# Altium footprint library User.PcbLib: 317 footprints (part 7 of 20)
Each footprint in its own frame and in the unit in brackets; x right, y up, seen from the top. Pads: shape width x height; smd on the part's side, far side on the other; paste and mask are expansions set on the pad; w line width, h text height; cw(c..) or ccw(c..) is an arc to the next point about the centre after c.
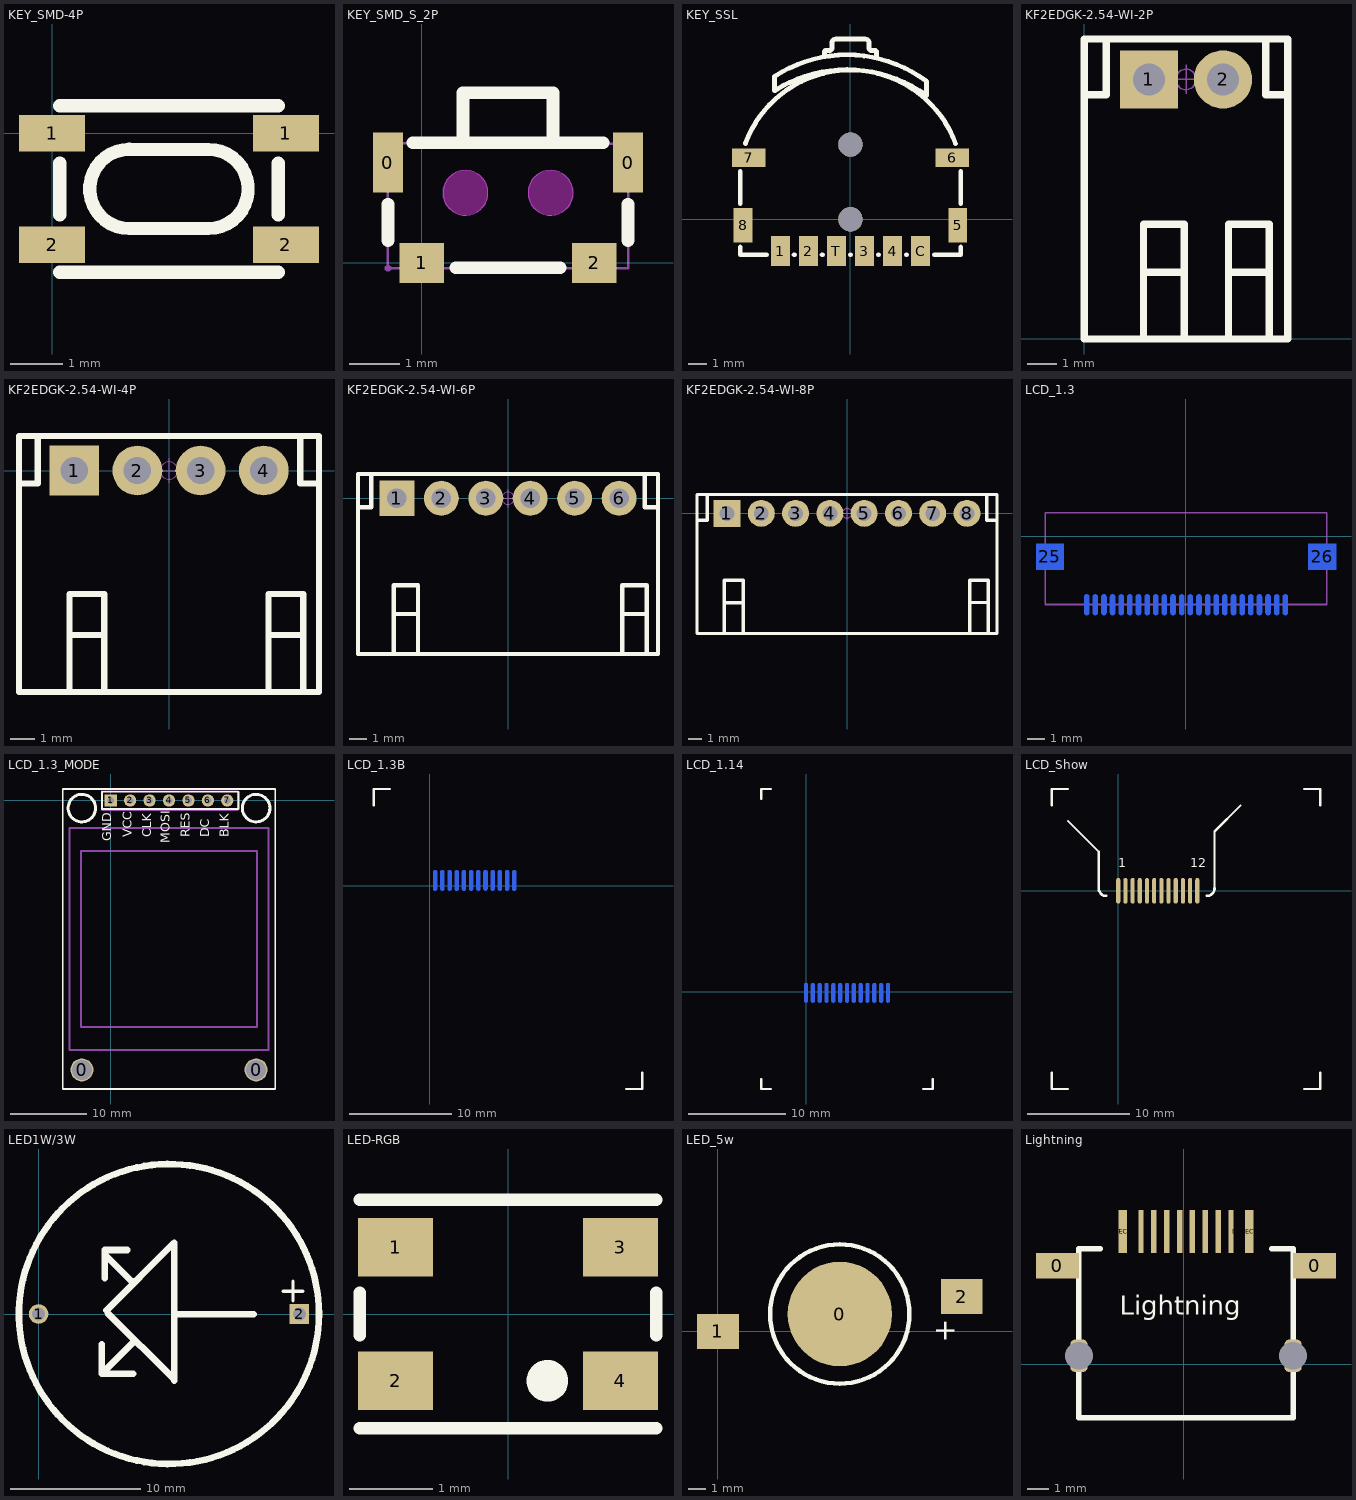
[diagram p6: the footprints below, top view; thin cyan lines are the x and y axes]

## KEY_SMD-4P [mm] "3*4*2.5MM"
pads (4):
  rect 1.27x0.7 smd: 1(0,0) 1(4.5,0) 2(0,-2.15) 2(4.5,-2.15)
Top Overlay:
  lines w0.254: 0.15,-2.675 4.35,-2.675 ; 0.15,-1.569 0.15,-0.581 ; 0.15,0.525 4.35,0.525 ; 0.151,-0.58 0.15,-0.581 ; 4.35,-1.569 4.35,-0.581 ; 0.15,-0.581 0.15,-0.581 ; 1.487,-1.836 cw(c1.487,-1.074) 1.487,-0.312 3.012,-0.313 cw(c3.012,-1.075) 3.011,-1.836 1.487,-1.836
3D body "3D_PCB4_2022-03-06.step": height 2.51, standoff 0, extent -0.099,-2.675 4.6,0.525

## KEY_SMD_S_2P [mil]
pads (4):
  rect 23.6x47.2 smd mask+2: 0(-26.6,78.8) 0(162.4,78.8)
  rect 35.4x31.5 smd mask+2: 1(0,0) 2(135.8,0)
Top Overlay:
  lines w10: -26.6,17.5 -26.6,46 ; -6.9,94.5 142.7,94.5 ; 26.8,-3.9 109,-3.9 ; 32.5,94.5 32.5,133.9 103.3,133.9 103.3,94.5 ; 162.4,17.5 162.4,46
Keep-Out Layer:
  board cut-out: 83.7,55.1 83.7,51.58 86.39,45.07 91.37,40.09 97.88,37.4 104.92,37.4 111.43,40.09 116.41,45.07 119.1,51.58 119.1,55.1 119.1,58.62 116.41,65.13 111.43,70.11 104.92,72.8 97.88,72.8 91.37,70.11 86.39,65.13 83.7,58.62
  board cut-out: 16.7,55.1 16.7,51.58 19.39,45.07 24.37,40.09 30.88,37.4 37.92,37.4 44.43,40.09 49.41,45.07 52.1,51.58 52.1,55.1 52.1,58.62 49.41,65.13 44.43,70.11 37.92,72.8 30.88,72.8 24.37,70.11 19.39,65.13 16.7,58.62
Mechanical 1:
  circle w0.2: c101.4,55.1 r17.7
  circle w0.2: c34.4,55.1 r17.7
Mechanical 15:
  region: 145.7,11.4 145.7,-4.3 126,-4.3 126,11.4
  region: 9.8,11.4 9.8,-4.3 -9.9,-4.3 -9.9,11.4
  region: 162.4,63 154.5,63 154.5,94.5 162.4,94.5
  region: -18.7,63 -26.6,63 -26.6,94.5 -18.7,94.5
  region: -29,-4.3 -29,-5.29 -27.59,-6.7 -25.61,-6.7 -24.2,-5.29 -24.2,-4.3 -24.2,-3.31 -25.61,-1.9 -27.59,-1.9 -29,-3.31
  lines w2: -26.6,-4.3 162.4,-4.3 162.4,93.7 104.1,93.7 103.7,94.1 103.7,132.7 104.1,133.1 32.5,133.5 32.5,94.1 -26.6,94.1 -26.6,-4.3
3D body "3D_PCB3_2022-03-08.step": height 74.8, standoff -15.76, extent -26.5,-7 162.5,126.88

## KEY_SSL [mm] "4PIN"
pads (12):
  rect 1x1.6 smd: 1(-3.75,-1.7) 2(-2.25,-1.7) 3(0.75,-1.7) 4(2.25,-1.7) C(3.75,-1.7) T(-0.75,-1.7)
  rect 1x1.85 smd: 5(5.75,-0.325) 8(-5.75,-0.325)
  rect 1.8x1 smd: 6(5.45,3.3) 7(-5.45,3.3)
  round 1.3 hole 1.3 unplated: ""(0,0) ""(0,4)
Top Overlay:
  lines w0.254: -5.9,-1.481 -5.9,-1.9 -4.481,-1.9 ; -5.9,0.831 -5.9,2.569 ; -5.623,4.048 cw(c0,2.002) 5.623,4.048 ; -3.019,-1.9 -2.981,-1.9 ; -1.519,-1.9 -1.481,-1.9 ; -1.4,8.94 cw(c-1.301,8.941) -1.3,9.04 ; -1.397,8.736 -1.397,8.939 ; -1.295,9.041 -1.092,9.041 ; -1.1,9.04 ccw(c-1.1,9.14) -1,9.14 ; -1,9.44 cw(c-0.799,9.439) -0.8,9.64 ; -0.991,9.142 -0.991,9.447 ; -0.787,9.65 0.787,9.65 ; -0.019,-1.9 0.019,-1.9 ; 0.8,9.64 cw(c0.799,9.439) 1,9.44 ; 0.991,9.142 0.991,9.447 ; 1,9.14 ccw(c1.1,9.14) 1.1,9.04 ; 1.092,9.041 1.295,9.041 ; 1.3,9.04 cw(c1.301,8.941) 1.4,8.94 ; 1.397,8.736 1.397,8.939 ; 1.481,-1.9 1.519,-1.9 ; 2.981,-1.9 3.019,-1.9 ; 4.481,-1.9 5.9,-1.9 5.9,-1.481 ; 5.9,0.831 5.9,2.569 ; -4.064,6.882 cw(c-0.186,0.802) 4.064,6.628 4.064,7.39 ccw(c-0.181,1.727) -4.064,7.644 -4.064,6.882

## KF2EDGK-2.54-WI-2P [mm] "长：6.93mm，宽：10.1mm，高：8.1mm"
pads (2):
  rect 2x2 hole 1.1: 1(2.22,8.898)
  round 2 hole 1.1: 2(4.76,8.898)
Top Overlay:
  lines w0.254: 0,8.38 0.757,8.38 0.757,10.285 ; 2.032,-0.002 2.032,3.935 3.429,3.935 3.429,-0.002 ; 2.032,2.284 3.429,2.284 ; 4.948,-0.002 4.948,3.935 6.345,3.935 6.345,-0.002 ; 4.948,2.284 6.345,2.284 ; 6.223,10.285 6.223,8.38 6.98,8.38 ; 0,-0.002 6.98,-0.002 6.98,10.285 0,10.285 0,-0.002
Mechanical 15:
  circle w0.05: c3.49,8.9 r0.35
  lines w0.05: 2.99,8.9 3.99,8.9 ; 3.49,8.4 3.49,9.4
3D body "KF2EDGK-2.54-WI-2P.STEP": height 8.15, standoff -3.25, extent 0,0 6.98,10.1

## KF2EDGK-2.54-WI-4P [mm] "长：12.06mm，宽：10.1mm，高：8.1mm"
pads (4):
  rect 2x2 hole 1.1: 1(-3.81,0)
  round 2 hole 1.1: 2(-1.27,0) 3(1.27,0) 4(3.81,0)
Top Overlay:
  lines w0.254: -6.03,-0.518 -5.273,-0.518 -5.273,1.387 ; -3.998,-8.9 -3.998,-4.963 -2.601,-4.963 -2.601,-8.9 ; -3.998,-6.614 -2.601,-6.614 ; 3.998,-8.9 3.998,-4.963 5.395,-4.963 5.395,-8.9 ; 3.998,-6.614 5.395,-6.614 ; 5.273,1.387 5.273,-0.518 6.03,-0.518 ; -6.03,-8.9 6.03,-8.9 6.03,1.387 -6.03,1.387 -6.03,-8.9
Mechanical 15:
  circle w0.05: c0,0 r0.35
  lines w0.05: -0.5,0 0.5,0 ; 0,-0.5 0,0.5
3D body "KF2EDGK-2.54-WI-4P.STEP": height 8.15, standoff -3.25, extent -6.03,-8.9 6.03,1.2

## KF2EDGK-2.54-WI-6P [mm] "长：17.1mm，宽：10.1mm，高：8.1mm"
pads (6):
  rect 2x2 hole 1.1: 1(-6.35,0.01)
  round 2 hole 1.1: 2(-3.81,0.01) 3(-1.27,0.01) 4(1.27,0.01) 5(3.81,0.01) 6(6.35,0.01)
Top Overlay:
  lines w0.254: -8.57,-0.508 -7.813,-0.508 -7.813,1.397 ; -6.538,-8.89 -6.538,-4.953 -5.141,-4.953 -5.141,-8.89 ; -6.538,-6.604 -5.141,-6.604 ; 6.538,-8.89 6.538,-4.953 7.935,-4.953 7.935,-8.89 ; 6.538,-6.604 7.935,-6.604 ; 7.813,1.397 7.813,-0.508 8.57,-0.508 ; -8.57,-8.89 -8.57,1.397 8.57,1.397 8.57,-8.89 -8.57,-8.89
Mechanical 15:
  circle w0.05: c0,0.01 r0.35
  lines w0.05: -0.5,0.01 0.5,0.01 ; 0,-0.49 0,0.51
3D body "KF2EDGK-2.54-WI-6P.STEP": height 8.15, standoff -3.25, extent -8.57,-8.89 8.57,1.21

## KF2EDGK-2.54-WI-8P [mm] "长：22.22mm，宽：10.1mm，高：8.1mm"
pads (8):
  rect 2x2 hole 1.1: 1(-8.89,0)
  round 2 hole 1.1: 2(-6.35,0) 3(-3.81,0) 4(-1.27,0) 5(1.27,0) 6(3.81,0) 7(6.35,0) 8(8.89,0)
Top Overlay:
  lines w0.254: -11.11,-0.518 -10.353,-0.518 -10.353,1.387 ; -11.11,1.387 -11.11,-8.9 11.11,-8.9 ; -11.11,1.397 11.11,1.397 11.11,-8.89 ; -9.078,-8.9 -9.078,-4.963 -7.681,-4.963 -7.681,-8.9 ; -9.078,-6.614 -7.681,-6.614 ; 9.078,-8.89 9.078,-4.953 10.475,-4.953 10.475,-8.89 ; 9.078,-6.604 10.475,-6.604 ; 10.353,1.397 10.353,-0.508 11.11,-0.508
Mechanical 15:
  circle w0.05: c0,0 r0.35
  lines w0.05: -0.5,0 0.5,0 ; 0,-0.5 0,0.5
3D body "KF2EDGK-2.54-WI-8P.STEP": height 8.15, standoff -3.25, extent -11.11,-8.9 11.11,1.2

## LCD_1.3 [mm]
pads (26):
  oval 0.3x1.2 smd far side: 1(-5.75,-3.958) 2(-5.25,-3.958) 3(-4.75,-3.958) 4(-4.25,-3.958) 5(-3.75,-3.958) 6(-3.25,-3.958) 7(-2.75,-3.958) 8(-2.25,-3.958) 9(-1.75,-3.958) 10(-1.25,-3.958) 11(-0.75,-3.958) 12(-0.25,-3.958) 13(0.25,-3.958) 14(0.75,-3.958) 15(1.25,-3.958) 16(1.75,-3.958) 17(2.25,-3.958) 18(2.75,-3.958) 19(3.25,-3.958) 20(3.75,-3.958) 21(4.25,-3.958) 22(4.75,-3.958) 23(5.25,-3.958) 24(5.75,-3.958)
  rect 1.6x1.5 smd far side: 25(-7.882,-1.169) 26(7.882,-1.169)
Bottom Overlay:
  lines w0.25: -8.15,-2.375 -8.15,-3.94 -6.35,-3.94 ; -8.15,-0.025 -8.15,1.36 8.15,1.36 8.15,-0.025 ; 6.35,-3.94 8.15,-3.94 8.15,-2.375
  text "1" at -6.351,-4.5 h1.52
Mechanical 15:
  lines w0.1: -8.15,-3.94 8.15,-3.94 8.15,1.36 -8.15,1.36 -8.15,-3.94
3D body: height 10, standoff 9, extent -10.175,-28.025 16.425,3.37
3D body: height 10.2, standoff 9, extent -9.186,-26.975 15.5,-2.38
3D body "HEADER-FPC-ZIF-SMD-Horizontal-0.5-24.stp": height 2.2, standoff -0.05, extent -8.05,-4.8 8.05,1.699

## LCD_1.3_MODE [mm]
pads (9):
  round 3 hole 2.6: 0(-3.77,-35.22) 0(19.01,-35.22)
  rect 1.6x1.6 hole 0.9: 1(0,0)
  round 1.6 hole 0.9: 2(2.54,0) 3(5.08,0) 4(7.62,0) 5(10.16,0) 6(12.7,0) 7(15.24,0)
Top Overlay:
  circle w0.4: c19.01,-1 r1.798
  circle w0.4: c-3.77,-1 r1.798
  lines w0.254: -6.27,-3.61 -6.27,1.5 ; -6.27,1.5 21.51,1.5 21.51,-37.72 -6.27,-37.72 -6.27,1.5 ; -1.143,-1.143 -1.143,1.143 16.7,1.143 16.7,-1.143 -1.143,-1.143
  text "BLK" at 15.85,-4.826 h2.03
  text "DC" at 13.291,-4.826 h2.03
  text "RES" at 10.751,-4.826 h2.03
  text "MOSI" at 8.109,-5.588 h2.03
  text "CLK" at 5.671,-4.824 h2.03
  text "VCC" at 3.131,-4.826 h2.03
  text "GND" at 0.489,-5.332 h2.03
Mechanical 15:
  lines w0.1: -1.18,-1.3 -1.18,1.3 16.62,1.3 16.62,-1.3 -1.18,-1.3
  lines w0.254: -5.38,-32.61 20.62,-32.61 20.62,-3.61 -5.38,-3.61 -5.38,-32.61 ; -3.88,-29.61 19.12,-29.61 19.12,-6.61 -3.88,-6.61 -3.88,-29.61
3D body "M3x8+6.STEP": height -1.95, standoff -15.95, extent -6.468,-37.57 -1.072,-32.87
3D body "M3x8+6.STEP": height -1.95, standoff -15.95, extent 16.312,-37.57 21.708,-32.87
3D body "HEADER 2.54X7.stp": height -1.9, standoff -13.1, extent -1.143,-1.228 16.637,1.27
3D body: height 11, standoff 10.5, extent -5.38,-32.61 20.599,-3.61
3D body: height 10.8, standoff 10, extent -6.27,-37.72 21.51,1.5
3D body "M3x6.STEP": height 17.05, standoff 11.05, extent 16.312,-37.57 21.708,-32.87
3D body "M3x6.STEP": height 17.05, standoff 11.05, extent -6.468,-37.57 -1.072,-32.87
3D body: height 11.3, standoff 11, extent -3.9,-29.642 19.12,-6.61

## LCD_1.3B [mm]
pads (12):
  oval 0.4x2 smd far side: 1(0.508,0.5) 2(1.208,0.5) 3(1.908,0.5) 4(2.608,0.5) 5(3.308,0.5) 6(4.008,0.5) 7(4.708,0.5) 8(5.408,0.5) 9(6.108,0.5) 10(6.808,0.5) 11(7.508,0.5) 12(8.208,0.5)
Top Overlay:
  lines w0.203: -5.48,7.808 -5.48,9.408 -3.88,9.408 ; 19.08,-19.812 20.68,-19.812 20.68,-18.212
Bottom Overlay:
  lines w0.203: -3.384,6.572 -3.384,4.032 -3.144,3.792 -1.144,3.792 -1.144,-0.008 ; 10.136,-0.008 10.136,4.335
  lines w0.254: -1.144,0.242 ccw(c-0.394,0.242) -0.394,-0.508 ; 9.386,-0.508 ccw(c9.386,0.242) 10.136,0.242
  text "1" at 0.771,2.16 h1.52
3D body: height 0.8, standoff 0.7, extent -5.48,-19.812 20.68,9.408
3D body: height 1, standoff 0.82, extent -3.88,-18.212 19.08,7.808

## LCD_1.14 [mm] "ST7789"
pads (13):
  oval 0.4x2 smd far side: 1(8.4,-0.127) 2(7.7,-0.127) 3(7,-0.127) 4(6.3,-0.127) 5(5.6,-0.127) 6(4.9,-0.127) 7(4.2,-0.127) 8(3.5,-0.127) 9(2.8,-0.127) 10(2.1,-0.127) 11(1.4,-0.127) 12(0.7,-0.127) 13(0,-0.127)
Top Overlay:
  lines w0.254: -4.6,-8.984 -4.6,-9.984 -3.6,-9.984 ; -4.6,19.762 -4.6,20.762 -3.6,20.762 ; 12,-9.984 13,-9.984 13,-8.984
Bottom Overlay:
  circle w0.254: c9.4,-3.746 r0.6
  circle w0.254: c-1,-3.746 r0.6
  lines w0.254: -2,-7.493 -2,0.254 ; -2,-3.746 -2,-1.746 -2,0.254 ; -1,0.254 -2,0.254 ; 9.4,0.254 10.4,0.254 10.4,-1.746 10.4,-3.746
  text "1" at 8.128,-1.746 h2.03
3D body: height 0.9, standoff 0.6, extent -4.064,-9.398 12.446,20.066
3D body: height 0.7, standoff 0.4, extent -4.6,-9.906 13,20.574

## LCD_Show [mm]
pads (12):
  oval 0.4x2.5 smd: 1(0,0) 2(0.7,0) 3(1.4,0) 4(2.1,0) 5(2.8,0) 6(3.5,0) 7(4.2,0) 8(4.9,0) 9(5.6,0) 10(6.3,0) 11(7,0) 12(7.7,0)
Top Overlay:
  lines w0.203: -6.48,-17.704 -6.48,-19.304 -4.88,-19.304 ; -6.48,8.316 -6.48,9.916 -4.88,9.916 ; -4.88,6.78 -1.9,3.8 -1.9,0 ; 9.38,0 9.38,5.78 11.925,8.325 ; 18.08,-19.304 19.68,-19.304 19.68,-17.704 ; 18.08,9.916 19.68,9.916 19.68,8.316
  lines w0.254: -1.9,0.25 ccw(c-1.15,0.25) -1.15,-0.5 ; 8.63,-0.5 ccw(c8.63,0.25) 9.38,0.25
  text "12" at 7,1.979 h1.52
  text "1" at 0,1.979 h1.52
3D body: height 1, standoff 0.82, extent -4.88,-17.704 18.08,8.316
3D body: height 0.8, standoff 0.7, extent -6.48,-19.304 19.68,9.916

## LED1W/3W [mm]
pads (2):
  round 1.5 hole 1: 1(0,0)
  rect 1.5x1.5 hole 1: 2(20,0)
Top Overlay:
  circle w0.508: c10,0 r11.5
  lines w0.254: 18.75,1.75 20.25,1.75 ; 19.5,1 19.5,2.5
  lines w0.508: 4.851,-2.311 4.851,-4.572 ; 5.08,2.743 5.08,4.902 6.807,4.902 ; 5.08,4.572 7.137,2.515 7.29,2.515 ; 5.207,0.279 10.389,5.461 ; 5.296,0.089 10.414,-5.029 10.414,-5.105 10.414,5.461 ; 7.239,-4.572 4.851,-4.572 ; 7.315,-2.057 7.315,-2.108 4.851,-4.572 ; 10.432,-0.025 16.485,-0.025

## LED-RGB [mm]
pads (4):
  rect 0.9x0.7 smd: 1(-1.35,0.8) 2(-1.35,-0.8) 3(1.35,0.8) 4(1.35,-0.8)
Top Overlay:
  circle w0.25: c0.472,-0.802 r0.125
  lines w0.152: -1.778,-1.372 1.778,-1.372 ; -1.778,-0.254 -1.778,0.254 ; -1.778,1.372 1.778,1.372 ; 1.778,-0.254 1.778,0.254
3D body "User Library-LED_ASMT-QTB0-0AA02.STEP": height 1.95, standoff -0.05, extent -1.815,-1.7 1.785,1.7

## LED_5w [mm]
pads (3):
  round 6 smd: 0(7,1)
  rect 2.4x2 smd: 1(0,0) 2(14,2)
Top Overlay:
  circle w0.254: c7,1 r4
  text "+" at 13.997,-0.652 h2.03

## Lightning [mm]
pads (14):
  rect 2x1.2 smd: 0(-5.9,4.6) 0(6.1,4.6)
  rect 0.254x2 smd: 1(2.2,6.2) 2(1.6,6.2) 3(1,6.2) 4(0.4,6.2) 5(-0.2,6.2) 6(-0.8,6.2) 7(-1.4,6.2) 8(-2,6.2)
  rect 0.4x2 smd: DETECT_1(3.05,6.2) DETECT_2(-2.85,6.2)
  rrect50% 0.8x1.5 hole 1.3 square: ""(-4.9,0.4) ""(5.1,0.4)
Top Overlay:
  lines w0.254: -3.9,5.4 -4.9,5.4 -4.9,0.4 -4.9,-2.5 5.1,-2.5 5.1,0.4 5.1,5.4 4.1,5.4
  text "Lightning" at -3,2 h1.52